# Altium footprint library AMA4B_adapter_board.PcbLib: 84 footprints (part 4 of 6)
Each footprint in its own frame and in the unit in brackets; x right, y up, seen from the top. Pads: shape width x height; smd on the part's side, far side on the other; paste and mask are expansions set on the pad; w line width, h text height; cw(c..) or ccw(c..) is an arc to the next point about the centre after c.
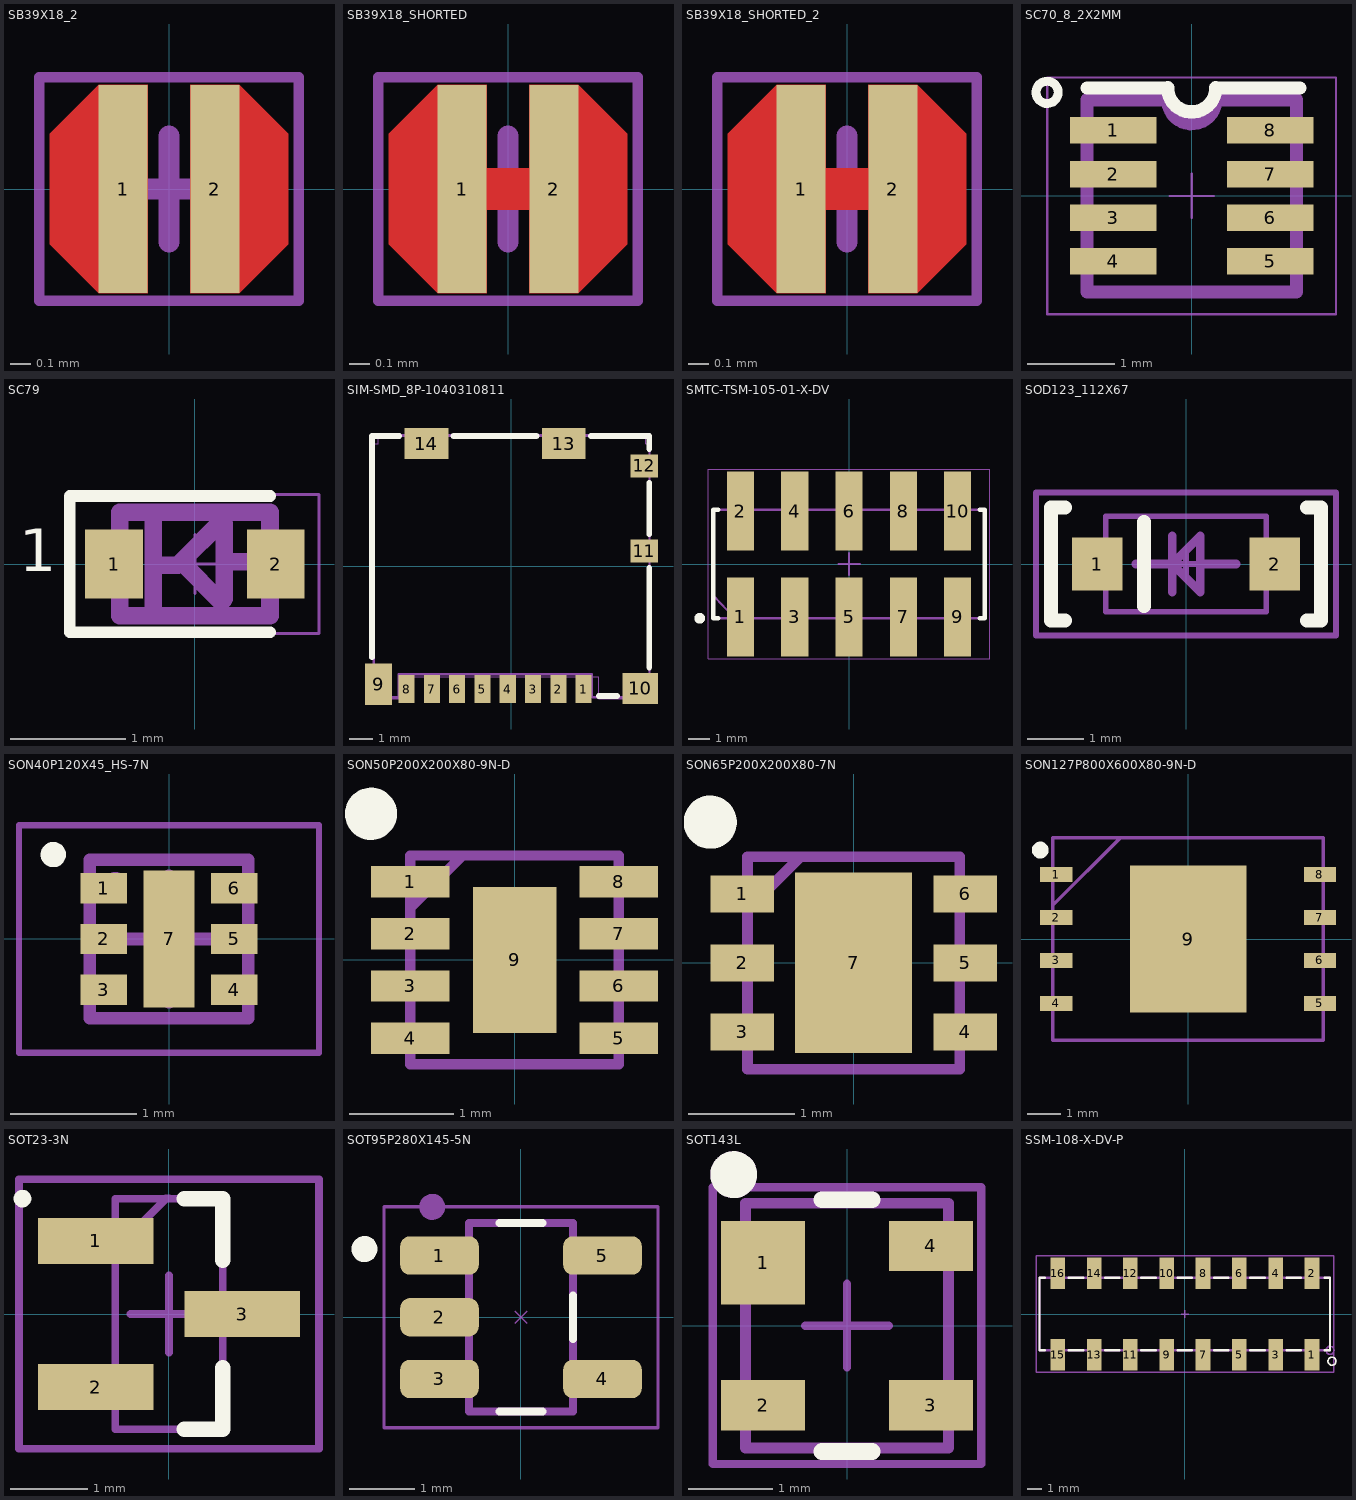
[diagram p3: the footprints below, top view; thin cyan lines are the x and y axes]

## SB39X18_2 [mm]
pads (2):
  rect 0.236x1 smd paste+0 mask+0.102: 1(-0.22,0) 2(0.22,0)
Top Layer:
  region: 0.572,0.264 0.572,-0.264 0.338,-0.5 0.102,-0.5 0.102,0.5 0.338,0.5
  region: 0.572,0.264 0.572,-0.264 0.338,-0.5 0.102,-0.5 0.102,0.5 0.338,0.5
  region: -0.572,-0.264 -0.572,0.264 -0.338,0.5 -0.102,0.5 -0.102,-0.5 -0.338,-0.5
  region: -0.572,-0.264 -0.572,0.264 -0.338,0.5 -0.102,0.5 -0.102,-0.5 -0.338,-0.5
Top Solder:
  region: 0.622,-0.279 0.622,0.279 0.366,0.536 0,0.536 0,-0.536 0.366,-0.536
  region: 0.622,-0.279 0.622,0.279 0.366,0.536 0,0.536 0,-0.536 0.366,-0.536
  region: -0.622,0.279 -0.622,-0.279 -0.366,-0.536 0,-0.536 0,0.536 -0.366,0.536
  region: -0.622,0.279 -0.622,-0.279 -0.366,-0.536 0,-0.536 0,0.536 -0.366,0.536
Board Shape:
  lines w0.051: -0.622,-0.536 0.622,-0.536 0.622,0.536 -0.622,0.536 -0.622,-0.536
  text "Solderbridge" at -0.508,0.292 h0.2
  text ".Designator" at 0.838,-0.787 h1.02
  text "No Assembly Req'd" at -0.622,-0.536 h0.2
Top Courtyard:
  lines w0.025: -0.622,-0.536 -0.622,0.536 0.622,0.536 0.622,-0.536 -0.622,-0.536
Top Component Center:
  lines w0.102: -0.254,0 0.254,0 ; 0,-0.254 0,0.254

## SB39X18_SHORTED [mm] "SB39X18_SHORTED"
pads (2):
  rect 0.236x1 smd paste+0 mask+0.102: 1(-0.22,0) 2(0.22,0)
Top Layer:
  rectangle: -0.481,-0.101 0.481,0.102
  region: -0.572,-0.264 -0.572,0.264 -0.338,0.5 -0.102,0.5 -0.102,-0.5 -0.338,-0.5
  region: -0.572,-0.264 -0.572,0.264 -0.338,0.5 -0.102,0.5 -0.102,-0.5 -0.338,-0.5
  region: 0.572,0.264 0.572,-0.264 0.338,-0.5 0.102,-0.5 0.102,0.5 0.338,0.5
  region: 0.572,0.264 0.572,-0.264 0.338,-0.5 0.102,-0.5 0.102,0.5 0.338,0.5
Top Solder:
  region: -0.622,0.279 -0.622,-0.279 -0.366,-0.536 0,-0.536 0,0.536 -0.366,0.536
  region: -0.622,0.279 -0.622,-0.279 -0.366,-0.536 0,-0.536 0,0.536 -0.366,0.536
  region: 0.622,-0.279 0.622,0.279 0.366,0.536 0,0.536 0,-0.536 0.366,-0.536
  region: 0.622,-0.279 0.622,0.279 0.366,0.536 0,0.536 0,-0.536 0.366,-0.536
Board Shape:
  lines w0.051: -0.622,-0.536 0.622,-0.536 0.622,0.536 -0.622,0.536 -0.622,-0.536
  text "No Assembly Req'd" at -0.622,-0.536 h0.2
  text ".Designator" at 0.828,-0.841 h1.02
  text "Solderbridge" at -0.508,0.292 h0.2
Top Courtyard:
  lines w0.025: -0.622,-0.536 0.622,-0.536 0.622,0.536 -0.622,0.536 -0.622,-0.536
Top Component Center:
  lines w0.102: -0.254,0 0.254,0 ; 0,-0.254 0,0.254

## SB39X18_SHORTED_2 [mm]
pads (2):
  rect 0.236x1 smd paste+0 mask+0.102: 1(-0.22,0) 2(0.22,0)
Top Layer:
  rectangle: -0.481,-0.101 0.481,0.102
  region: -0.572,-0.264 -0.572,0.264 -0.338,0.5 -0.102,0.5 -0.102,-0.5 -0.338,-0.5
  region: -0.572,-0.264 -0.572,0.264 -0.338,0.5 -0.102,0.5 -0.102,-0.5 -0.338,-0.5
  region: 0.572,0.264 0.572,-0.264 0.338,-0.5 0.102,-0.5 0.102,0.5 0.338,0.5
  region: 0.572,0.264 0.572,-0.264 0.338,-0.5 0.102,-0.5 0.102,0.5 0.338,0.5
Top Solder:
  region: -0.622,0.279 -0.622,-0.279 -0.366,-0.536 0,-0.536 0,0.536 -0.366,0.536
  region: -0.622,0.279 -0.622,-0.279 -0.366,-0.536 0,-0.536 0,0.536 -0.366,0.536
  region: 0.622,-0.279 0.622,0.279 0.366,0.536 0,0.536 0,-0.536 0.366,-0.536
  region: 0.622,-0.279 0.622,0.279 0.366,0.536 0,0.536 0,-0.536 0.366,-0.536
Board Shape:
  lines w0.051: -0.622,-0.536 -0.622,0.536 0.622,0.536 0.622,-0.536 -0.622,-0.536
  text ".Designator" at 0.968,-0.311 h1.02
  text "Solderbridge" at -0.508,0.292 h0.2
  text "No Assembly Req'd" at -0.622,-0.536 h0.2
Top Courtyard:
  lines w0.025: -0.622,-0.536 0.622,-0.536 0.622,0.536 -0.622,0.536 -0.622,-0.536
Top Component Center:
  lines w0.102: -0.254,0 0.254,0 ; 0,-0.254 0,0.254

## SC70_8_2X2MM [mil] "SC70_8_2X2MM"
pads (8):
  rect 39x12 smd mask+1.97: 1(-35.35,29.5) 2(-35.35,9.8) 3(-35.35,-9.8) 4(-35.35,-29.5) 5(35.45,-29.5) 6(35.45,-9.8) 7(35.45,9.8) 8(35.45,29.5)
Top Overlay:
  circle w4: c-65.11,46.64 r5
  lines w6: -47.15,48.6 -11.35,48.6 ; -10.8,48.65 ccw(c0.05,48.65) 10.9,48.65 ; 11.4,48.62 48.7,48.62
Board Shape:
  lines w6: -11.35,43.3 -47.15,43.3 -47.15,-43.3 47.25,-43.3 47.25,43.3 10.05,43.3 ; -10.65,45 ccw(c0.06,43.32) -9.55,38.3 ccw(c0.05,43.38) 10.66,45.7
  text ".Designator" at -90.13,7.51 h40
  text "1" at -79.05,29.8 h25
Top Courtyard:
  lines w1: -65.05,-53.3 -65.05,53.3 65.05,53.3 65.05,-53.3 -65.05,-53.3
Top Component Center:
  lines w1: -9.95,0 10.05,0 ; 0.05,-10 0.05,10
3D body: height 150, standoff 0, extent -55.05,-43.3 55.05,43.3

## SC79 [mm] "SC79"
pads (2):
  rect 0.5x0.6 smd paste-0.05 mask+0.05: 1(-0.7,0) 2(0.7,0)
Top Overlay:
  lines w0.102: 0.652,-0.591 -1.085,-0.591 -1.085,0.588 0.652,0.588
  text "1" at -1.523,-0.184 h0.64
Board Shape:
  lines w0.152: -0.361,-0.442 -0.361,0.381 ; -0.348,-0.01 -0.147,-0.01 -0.119,0.018 ; 0.254,0.018 0.577,0.018 ; -0.119,0.018 0.213,0.351 0.254,0.351 0.254,-0.302 0.229,-0.33 -0.119,0.018 ; -0.65,-0.45 -0.65,0.45 0.65,0.45 0.65,-0.45 -0.65,-0.45
  text ".Designator" at -1.7,0.9 h1.02
  text "1" at -1.473,-0.305 h0.64
Top Courtyard:
  lines w0.025: -1.075,-0.6 1.075,-0.6 1.075,0.6 -1.075,0.6 -1.075,-0.6
Top Component Center:
  lines w0.025: -0.254,0 0.254,0 ; 0,-0.254 0,0.254

## SIM-SMD_8P-1040310811 [mm]
pads (14):
  rect 0.7x1.2 smd paste+0 mask+0.051: 1(3.138,-5.337) 2(2.037,-5.337) 3(0.938,-5.337) 4(-0.162,-5.337) 5(-1.263,-5.337) 6(-2.363,-5.337) 7(-3.462,-5.337) 8(-4.562,-5.337)
  rect 1.17x1.8 smd paste+0 mask+0.051: 9(-5.773,-5.138)
  rect 1.55x1.35 smd paste+0 mask+0.051: 10(5.598,-5.313)
  rect 1.2x1 smd paste+0 mask+0.051: 11(5.773,0.663) 12(5.773,4.363)
  rect 1.9x1.35 smd paste+0 mask+0.051: 13(2.273,5.337) 14(-3.697,5.337)
Top Overlay:
  lines w0.254: -6.071,-3.956 -6.071,5.665 -4.879,5.665 ; -2.516,5.665 1.091,5.665 ; 3.454,5.665 5.994,5.665 5.994,5.094 ; 3.794,-5.638 4.591,-5.638 ; 5.994,-4.406 5.994,-0.069 ; 5.994,1.394 5.994,3.631
Top Assembly:
  lines w0.1: -6,5.7 6,5.7 ; -6,5.7 -6,5.7 ; -6,5.7 -6,-5.7 -4.9,-5.7 ; -4.9,-5.7 -4.9,-4.7 3.5,-4.7 3.5,-5.7 ; -4.9,-5.7 -4.9,-5.7 ; 3.5,-5.7 6,-5.7 6,5.7 ; 3.5,-5.7 3.5,-5.7 ; 6,5.7 6,5.7
  text ".Designator" at -3.434,-0.345 h1.52
Top Courtyard:
  region: 6.002,-5.69 5.977,-5.69 5.942,-5.725 5.942,-5.775 5.977,-5.81 6.002,-5.81 6.027,-5.81 6.062,-5.775 6.062,-5.725 6.027,-5.69 6.002,-5.69
  region: -5.963,-4.437 -5.313,-4.437 -5.313,-5.738 -5.963,-5.738
  region: 5.002,-4.9 6.002,-4.9 6.002,-5.75 5.002,-5.75
  region: 5.352,0.988 6.002,0.988 6.002,0.338 5.352,0.338
  region: 5.352,4.688 6.002,4.688 6.002,4.038 5.352,4.038
  region: 1.572,5.65 2.972,5.65 2.972,4.75 1.572,4.75
  region: -4.397,5.65 -2.997,5.65 -2.997,4.75 -4.397,4.75
  region: -4.732,-4.75 -4.392,-4.75 -4.392,-5.7 -4.732,-5.7
  region: -3.632,-4.75 -3.292,-4.75 -3.292,-5.7 -3.632,-5.7
  region: -2.533,-4.75 -2.193,-4.75 -2.193,-5.7 -2.533,-5.7
  region: -1.432,-4.75 -1.092,-4.75 -1.092,-5.7 -1.432,-5.7
  region: -0.332,-4.75 0.008,-4.75 0.008,-5.7 -0.332,-5.7
  region: 0.768,-4.75 1.108,-4.75 1.108,-5.7 0.768,-5.7
  region: 1.867,-4.75 2.207,-4.75 2.207,-5.7 1.867,-5.7
  region: 2.968,-4.75 3.308,-4.75 3.308,-5.7 2.968,-5.7
  lines w0.051: -5.95,-5.75 -4.86,-5.75 -4.86,-4.8 3.8,-4.8 3.8,-5.75 6,-5.75 6,5.33 5.85,5.33 5.85,5.65 -5.8,5.65 -5.8,5.33 -5.95,5.33 -5.95,-5.75
3D body "USUp-SIM1.step": height 1.47, standoff 0, extent -5.975,-5.55 5.975,5.85

## SMTC-TSM-105-01-X-DV [mm] "Double Row Gullwing ASM, 2x5 Pins, Vertical, 2.54mm Pitch, Male"
height 9.9
pads (10):
  rect 1.27x3.68 smd: 1(-5.08,-2.475) 2(-5.08,2.475) 3(-2.54,-2.475) 4(-2.54,2.475) 5(0,-2.475) 6(0,2.475) 7(2.54,-2.475) 8(2.54,2.475) 9(5.08,-2.475) 10(5.08,2.475)
Top Overlay:
  circle w0.25: c-6.985,-2.54 r0.125
  lines w0.2: -6.115,-2.54 -6.35,-2.54 -6.35,2.54 -6.115,2.54 ; 6.115,-2.54 6.35,-2.54 6.35,2.54 6.115,2.54
Board Shape:
  lines w0.1: -6.35,-2.54 -6.35,2.54 6.35,2.54 6.35,-2.54 -6.35,-2.54
  lines w0.102: -6.35,-1.475 -5.346,-2.54
  text ".Designator" at -2.289,-0.23 h1.02
Top Courtyard:
  lines w0.05: -6.575,-4.44 6.575,-4.44 6.575,4.44 -6.575,4.44 -6.575,-4.44
Top Component Center:
  lines w0.1: -0.5,0 0.5,0 ; 0,-0.5 0,0.5
3D body "TSM-105-01-X-DV.step": height 9.65, standoff 0, extent -6.35,-3.683 6.35,3.683

## SOD123_112X67 [mil] "SOD123_112X67"
pads (2):
  rect 35.4x37.4 smd: 1(-62,0) 2(62,0)
Top Overlay:
  lines w9.8: -84.6,-39.4 -94.5,-39.4 -94.5,39.4 -84.6,39.4 ; -29.5,-29.5 -29.5,29.5 ; 84.6,-39.4 94.5,-39.4 94.5,39.4 84.6,39.4
Board Shape:
  lines w4: -56.1,-33.5 -56.1,33.5 56.1,33.5 56.1,-33.5 -56.1,-33.5
  lines w6: -35,0 -9.6,0 ; -9.6,-19.7 -9.6,19.7 ; 10,0 35,0 ; -9.6,0 10,-19.7 10,19.7 -9.6,0
  text ".Designator" at -1,40 h40
Top Courtyard:
  lines w4: -105,-50 -105,50 105,50 105,-50 -105,-50
Top Component Center:
  lines w4: -10,0 10,0 ; 0,-10 0,10
3D body "SOD-323.STEP": height 39.37, standoff 1.73, extent -51.62,-26.34 52.63,24.84

## SON40P120X45_HS-7N [mm] "SON, 6-Leads, Body 1.20x1.20mm, Pitch 0.40mm, Thermal Pad 2.40x0.79mm, IPC Medium Density"
height 0.45
pads (7):
  rect 0.37x0.24 smd paste+0 mask+0.03: 1(-0.515,0.4) 2(-0.515,0) 3(-0.515,-0.4) 4(0.515,-0.4) 5(0.515,0) 6(0.515,0.4)
  rect 0.4x1.08 smd paste+0 mask+0.03: 7(0,0)
Top Overlay:
  circle w0.1: c-0.914,0.667 r0.05
Board Shape:
  circle w0.152: c-0.426,0.444 r0.009
  lines w0.1: -0.625,-0.625 -0.625,0.625 0.625,0.625 0.625,-0.625 -0.625,-0.625
  text ".Designator" at -2.261,-0.275 h1
Top Courtyard:
  lines w0.05: -1.185,-0.9 1.185,-0.9 1.185,0.9 -1.185,0.9 -1.185,-0.9
  lines w0.051: -1.185,-0.9 1.185,-0.9 1.185,0.9 -1.185,0.9 -1.185,-0.9
Top Component Center:
  lines w0.1: -0.5,0 0.5,0 ; 0,-0.5 0,0.5
3D body "SON40P120X45_HS-7N.step": height 0.45, standoff 0, extent -0.626,-0.625 0.626,0.625

## SON50P200X200X80-9N-D [mm]
pads (9):
  rect 0.75x0.3 smd: 1(-1,0.75) 2(-1,0.25) 3(-1,-0.25) 4(-1,-0.75) 5(1,-0.75) 6(1,-0.25) 7(1,0.25) 8(1,0.75)
  rect 0.8x1.4 smd: 9(0,0)
Top Overlay:
  circle w0.25: c-1.375,1.4 r0.125
Top 3D Body:
  lines w0.1: -1,0.5 -0.5,1 ; -1,-1 -1,1 1,1 1,-1 -1,-1
3D body "MAX8902BATA+.stp": height 0.8, standoff 0, extent -1.05,-1 1.05,1

## SON65P200X200X80-7N [mm]
pads (7):
  rect 0.6x0.35 smd: 1(-1.05,0.65) 2(-1.05,0) 3(-1.05,-0.65) 4(1.05,-0.65) 5(1.05,0) 6(1.05,0.65)
  rect 1.1x1.7 smd: 7(0,0)
Top Overlay:
  circle w0.25: c-1.35,1.325 r0.125
Top Assembly:
  lines w0.1: -1,0.5 -0.5,1 ; -1,-1 -1,1 1,1 1,-1 -1,-1
  text ".Designator" at -1.126,-0.113 h0.5
3D body "TLV75801PDRVR.stp": height 0.8, standoff 0, extent -1.05,-1 1.05,1

## SON127P800X600X80-9N-D [mm]
pads (9):
  rect 0.95x0.45 smd: 1(-3.9,1.905) 2(-3.9,0.635) 3(-3.9,-0.635) 4(-3.9,-1.905) 5(3.9,-1.905) 6(3.9,-0.635) 7(3.9,0.635) 8(3.9,1.905)
  rect 3.45x4.35 smd: 9(0,0)
Top Overlay:
  circle w0.25: c-4.375,2.63 r0.125
Top Assembly:
  lines w0.1: -4,1 -2,3 ; -4,-3 -4,3 4,3 4,-3 -4,-3
  text ".Designator" at -2.252,-0.226 h1
3D body "W25N01GVZEIG_TR.stp": height 0.8, standoff 0, extent -4.05,-3 4.05,3

## SOT23-3N [mm] "SOT23, 3-Leads, Body 2.9x1.3mm, Pitch 0.95mm, Lead Span 2.5mm, IPC Medium Density"
height 1.1
pads (3):
  rect 1.5x0.6 smd: 1(-0.95,0.95) 2(-0.95,-0.95) 3(0.95,0)
Top Overlay:
  circle w0.152: c-1.905,1.5 r0.038
  lines w0.2: 0.2,-1.5 0.7,-1.5 0.7,-0.7 ; 0.2,1.5 0.7,1.5 0.7,0.7
Board Shape:
  lines w0.1: -0.7,-1.5 0.7,-1.5 0.7,1.5 -0.7,1.5 -0.7,-1.5
  lines w0.102: -0.692,0.847 -0.039,1.5 0,1.5
  text ".Designator" at -2.289,-0.23 h1.02
Top Courtyard:
  lines w0.1: -1.95,-1.75 -1.95,1.75 1.95,1.75 1.95,-1.75 -1.95,-1.75
Top Component Center:
  lines w0.1: -0.5,0 0.5,0 ; 0,-0.5 0,0.5
3D body "SOT23.STEP": height 1.08, standoff 0, extent -1.345,-1.5 1.295,1.5

## SOT95P280X145-5N [mm]
pads (5):
  rrect50% 1.21x0.59 smd: 1(-1.255,0.95) 2(-1.255,0) 3(-1.255,-0.95) 4(1.255,-0.95) 5(1.255,0.95)
Top Overlay:
  circle w0.2: c-2.41,1.05 r0.1
  lines w0.127: -0.33,-1.45 0.33,-1.45 ; -0.33,1.45 0.33,1.45 ; 0.8,-0.335 0.8,0.335
Board Shape:
  lines w0.127: -0.8,-1.45 -0.8,1.45 0.8,1.45 0.8,-1.45 -0.8,-1.45
  lines w0.2: -1.267,1.7 cw(c-1.367,1.7) -1.267,1.703
  text "'.Designator'" at 0.156,-0.6 h1
Top Courtyard:
  lines w0.05: -2.11,-1.7 2.11,-1.7 2.11,1.7 -2.11,1.7 -2.11,-1.7
Top Component Center:
  lines w0.025: -0.09,-0.09 0,0 ; -0.09,0.09 0,0 ; 0.09,-0.09 0,0 ; 0.09,0.09 0,0

## SOT143L [mm]
pads (4):
  rect 1x1 smd: 1(-1,0.75)
  rect 1x0.6 smd: 2(-1,-0.95) 3(1,-0.95) 4(1,0.95)
Top Overlay:
  circle w0.305: c-1.35,1.8 r0.127
  lines w0.2: -0.3,-1.5 0.3,-1.5 ; -0.3,1.5 0.3,1.5
Board Shape:
  circle w0.305: c-1.35,1.8 r0.127
  lines w0.127: -1.21,-1.46 1.21,-1.46 1.21,1.46 -1.21,1.46 -1.21,-1.46
  lines w0.2: -0.3,-1.5 0.3,-1.5 ; -0.3,1.5 0.3,1.5
  text ".Designator" at -0.319,3.459 h1.52
Top 3D Body:
  lines w0.127: -1.21,-1.46 1.21,-1.46 1.21,1.46 -1.21,1.46 -1.21,-1.46
Top Courtyard:
  lines w0.1: -1.6,-1.65 1.6,-1.65 1.6,1.65 -1.6,1.65 -1.6,-1.65
Top Component Center:
  lines w0.1: -0.5,0 0.5,0 ; 0,-0.5 0,0.5
3D body "User Library-sot143.STEP": height 1, standoff 0, extent -1.21,-1.46 1.21,1.46

## SSM-108-X-DV-P [mil] "SSM-108-X-DV-P"
pads (16):
  rect 40.2x87.4 smd: 1(350,-112.5) 2(350,112.5) 3(250,-112.5) 4(250,112.5) 5(150,-112.5) 6(150,112.5) 7(50,-112.5) 8(50,112.5) 9(-50,-112.5) 10(-50,112.5) 11(-150,-112.5) 12(-150,112.5) 13(-250,-112.5) 14(-250,112.5) 15(-350,-112.5) 16(-350,112.5)
Top Overlay:
  circle w4: c405,-130 r11.18
  lines w6: -385,-100 -400,-100 -400,100 -385,100 ; -320,-100 -280,-100 ; -320,100 -280,100 ; -220,-100 -180,-100 ; -220,100 -180,100 ; -120,-100 -80,-100 ; -120,100 -80,100 ; -20,-100 20,-100 ; -20,100 20,100 ; 80,-100 120,-100 ; 80,100 120,100 ; 180,-100 220,-100 ; 180,100 220,100 ; 280,-100 320,-100 ; 280,100 320,100 ; 385,-100 400,-100 400,100 385,100
Board Shape:
  circle w4: c400,-100 r11.18
  lines w6: -400,-100 400,-100 400,100 -400,100 -400,-100
  text ".Designator" at -90.13,7.51 h40
Top Courtyard:
  lines w4: -410,-160 -410,160 410,160 410,-160 -410,-160
Top Component Center:
  lines w4: -10,0 10,0 ; 0,-10 0,10
3D body "SSM-108-L-DV-P-TR.stp": height 338, standoff -4, extent -400,-138.5 400,138.5